# Altium footprint library Semicon-Discrete.pcblib: 205 footprints (part 2 of 13)
Each footprint in its own frame and in the unit in brackets; x right, y up, seen from the top. Pads: shape width x height; smd on the part's side, far side on the other; paste and mask are expansions set on the pad; w line width, h text height; cw(c..) or ccw(c..) is an arc to the next point about the centre after c.
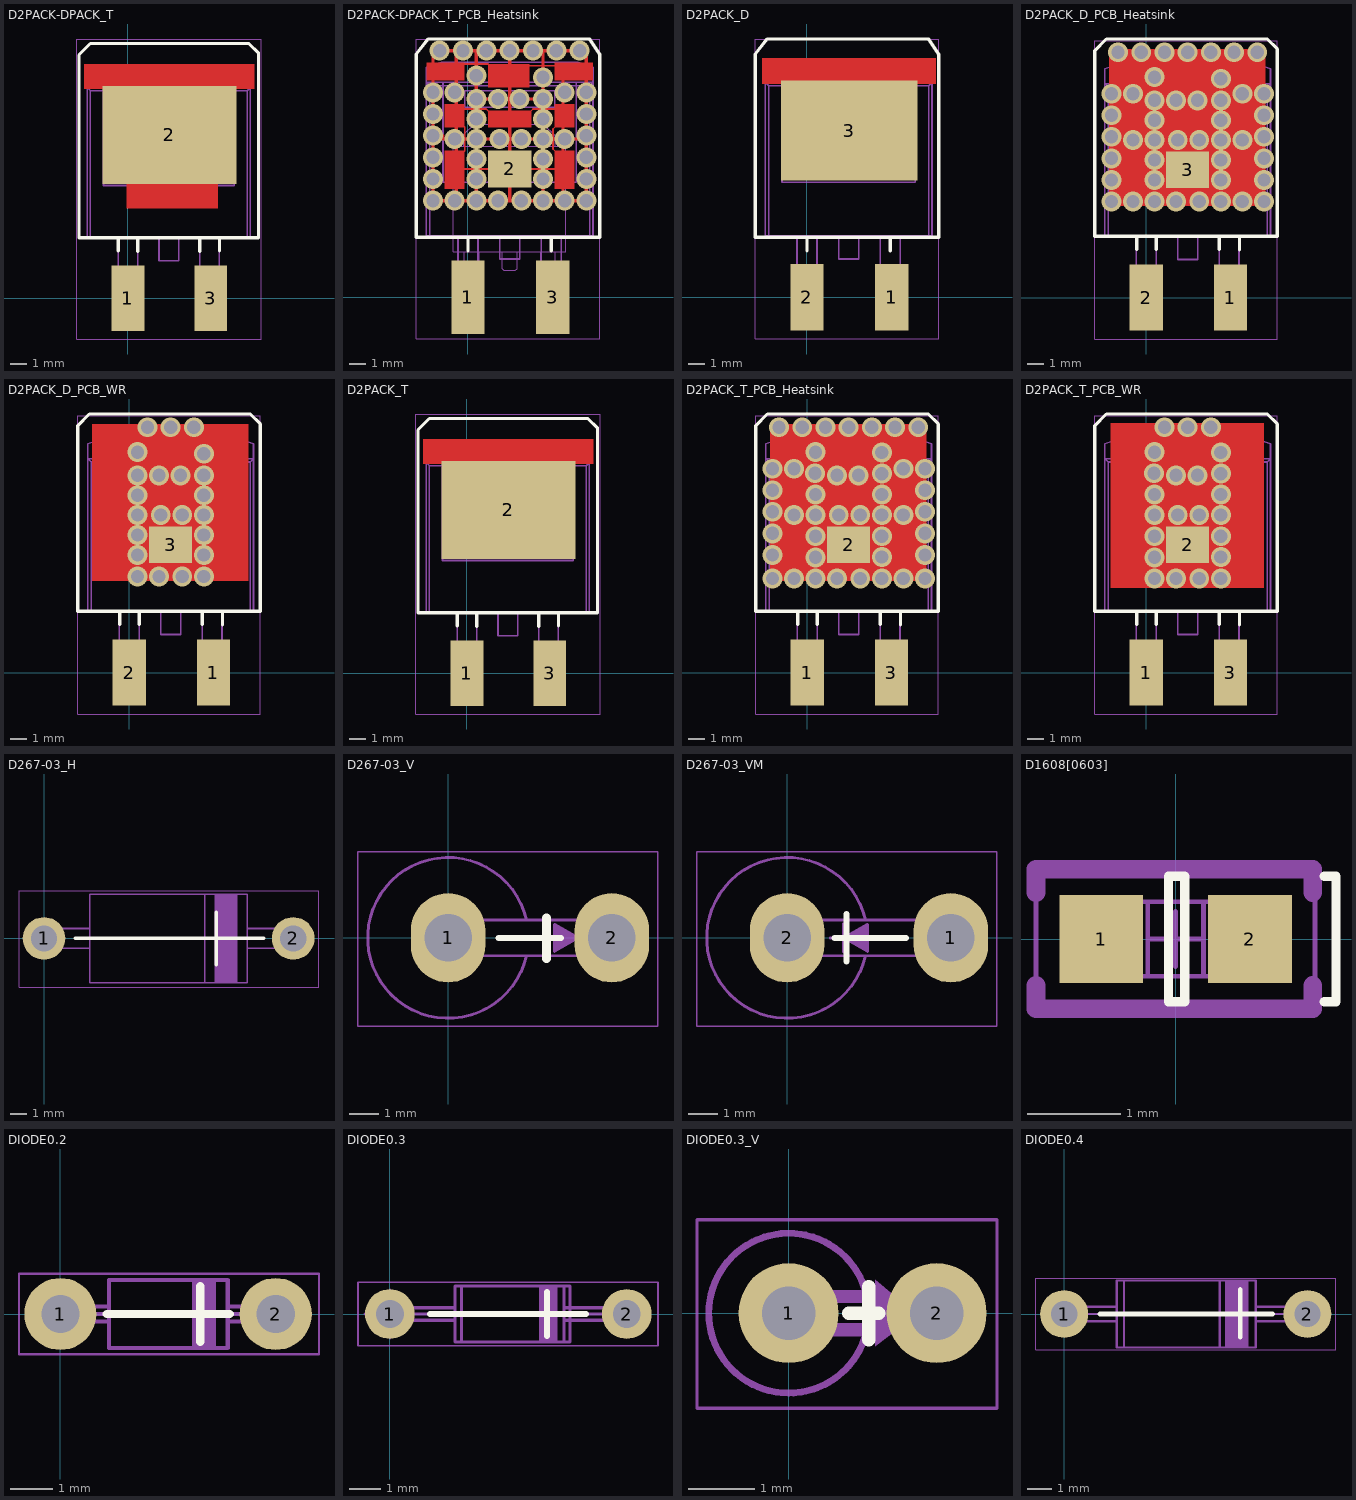
[diagram p1: the footprints below, top view; thin cyan lines are the x and y axes]

## D2PACK-DPACK_T [mm]
height 5
pads (3):
  rect 2x4 smd: 1(0,0) 3(5.08,0)
  rect 8.2x6 smd: 2(2.54,10)
TopLayer:
  rectangle: -2.7,12.8 7.75,14.35
  rectangle: -0.1,5.5 5.5,7.05
TopOverlay:
  lines w0.2: -0.6,2.9 -0.6,3.7 ; 0.6,2.875 0.6,3.675 ; 4.4,2.875 4.4,3.675 ; 5.6,2.9 5.6,3.7 ; -3,3.7 -3,14.9 -2.3,15.6 7.4,15.6 8,15 8,3.7 -3,3.7
TopPaste:
  rectangle: -2.75,12.9 7.75,14.35
  rectangle: 0,5.6 5.3,7.25
TopSolder:
  rectangle: -2.85,12.75 7.85,14.45
  rectangle: -0.25,5.3 5.6,7.15
2-TopCompOutl:
  lines w0.1: -2.3,3.7 -2.3,12.7 ; -0.6,1.7 0.6,1.7 ; -0.6,3.7 -0.6,1.4 -0.4,1.1 -0.4,-1.2 0,-1.2 0.4,-1.2 0.4,1.1 0.6,1.4 0.6,3.7 ; -0.4,0.9 0.4,0.9 ; 1.9,3.7 1.9,2.3 2.5,2.3 3.1,2.3 3.1,3.7 ; 4.4,1.7 5.6,1.7 ; 4.4,3.7 4.4,1.4 4.6,1.1 4.6,-1.2 5,-1.2 5.4,-1.2 5.4,1.1 5.6,1.4 5.6,3.7 ; 4.6,0.9 5.4,0.9 ; 7.3,3.7 7.3,12.7 ; -2.5,12.9 -2.3,12.7 ; -2.5,12.9 -2.5,13.8 -1.6,14.1 2.5,14.1 6.6,14.1 7.5,13.8 7.5,12.9 ; -2.5,12.9 2.5,12.9 7.5,12.9 ; -2.5,12.9 -2.5,3.7 2.5,3.7 7.5,3.7 7.5,12.9 ; -2.3,12.7 2.5,12.7 7.3,12.7 ; 7.3,12.7 7.5,12.9
4-TopCourty:
  circle w0.1: c0,0 r0.35
  lines w0.05: -3.15,-2.5 8.175,-2.5 8.175,15.875 -3.15,15.875 -3.15,-2.5
  lines w0.1: -0.55,0 0.55,0 ; 0,-0.55 0,0.55
5-MCadOutl:
  lines w0.1: -2.5,12.9 -2.5,13.8 -1.6,14.1 2.5,14.1 6.6,14.1 7.5,13.8 7.5,12.9 6.5,12.9 6.5,6.9 2.5,6.9 -1.5,6.9 -1.5,12.9 -2.5,12.9 ; -0.2,11.4 2.5,11.4 5.2,11.4 5.2,12.4 2.5,12.4 -0.2,12.4 -0.2,11.4
7-TopAssy:
  lines w0.1: -2.3,3.7 -2.3,12.7 ; -0.6,1.7 0.6,1.7 ; -0.6,3.7 -0.6,1.4 -0.4,1.1 -0.4,-1.2 0,-1.2 0.4,-1.2 0.4,1.1 0.6,1.4 0.6,3.7 ; -0.4,0.9 0.4,0.9 ; 1.9,3.7 1.9,2.3 2.5,2.3 3.1,2.3 3.1,3.7 ; 4.4,1.7 5.6,1.7 ; 4.4,3.7 4.4,1.4 4.6,1.1 4.6,-1.2 5,-1.2 5.4,-1.2 5.4,1.1 5.6,1.4 5.6,3.7 ; 4.6,0.9 5.4,0.9 ; 7.3,3.7 7.3,12.7 ; -2.5,12.9 -2.5,3.7 2.5,3.7 7.5,3.7 7.5,12.9 ; -2.5,12.9 2.5,12.9 7.5,12.9 ; -2.5,12.9 -2.5,13.8 -1.6,14.1 2.5,14.1 6.6,14.1 7.5,13.8 7.5,12.9 ; -2.5,12.9 -2.3,12.7 ; -2.3,12.7 2.5,12.7 7.3,12.7 ; 7.3,12.7 7.5,12.9
  text ".Designator" at 0.8,5.4 h2.2
3D body "D2PACK_D.STEP": height 4.5, standoff 0, extent -2.525,-1.5 7.475,14.08

## D2PACK-DPACK_T_PCB_Heatsink [mm]
pads (3):
  rect 2x4.4 smd: 1(0,0) 3(5.08,0)
  rect 2.6x2.2 smd: 2(2.5,7.7)
via 3.2,5.8 diameter 1.2 hole 0.8
via 4.5,5.8 diameter 1.2 hole 0.8
via 5.8,5.8 diameter 1.2 hole 0.8
via 1.8,5.8 diameter 1.2 hole 0.8
via 0.5,5.8 diameter 1.2 hole 0.8
via -0.8,5.8 diameter 1.2 hole 0.8
via -2.1,5.8 diameter 1.2 hole 0.8
via -2.1,7.1 diameter 1.2 hole 0.8
via -2.1,8.4 diameter 1.2 hole 0.8
via -2.1,9.7 diameter 1.2 hole 0.8
via -2.1,11 diameter 1.2 hole 0.8
via -1.7,14.8 diameter 1.2 hole 0.8
via -2.1,12.3 diameter 1.2 hole 0.8
via 7.1,12.3 diameter 1.2 hole 0.8
via 6.7,14.8 diameter 1.2 hole 0.8
via 7.1,11 diameter 1.2 hole 0.8
via 7.1,9.7 diameter 1.2 hole 0.8
via 7.1,8.4 diameter 1.2 hole 0.8
via 7.1,7.1 diameter 1.2 hole 0.8
via 7.1,5.8 diameter 1.2 hole 0.8
via 0.5,11.9 diameter 1.2 hole 0.8
via 0.5,13.3 diameter 1.2 hole 0.8
via 1.1,14.8 diameter 1.2 hole 0.8
via -0.3,14.8 diameter 1.2 hole 0.8
via 1.8,11.9 diameter 1.2 hole 0.8
via 0.5,10.7 diameter 1.2 hole 0.8
via 0.5,9.5 diameter 1.2 hole 0.8
via 0.5,8.3 diameter 1.2 hole 0.8
via 0.5,7.1 diameter 1.2 hole 0.8
via 4.5,11.9 diameter 1.2 hole 0.8
via 3.9,14.8 diameter 1.2 hole 0.8
via 2.5,14.8 diameter 1.2 hole 0.8
via 4.5,13.2 diameter 1.2 hole 0.8
via 3.1,11.9 diameter 1.2 hole 0.8
via 4.5,10.7 diameter 1.2 hole 0.8
via 4.5,9.5 diameter 1.2 hole 0.8
via 4.5,8.3 diameter 1.2 hole 0.8
via 4.5,7.1 diameter 1.2 hole 0.8
via 3.2,9.5 diameter 1.2 hole 0.8
via 1.9,9.5 diameter 1.2 hole 0.8
via -0.8,9.5 diameter 1.2 hole 0.8
via 5.3,14.8 diameter 1.2 hole 0.8
via 5.8,12.3 diameter 1.2 hole 0.8
via 5.8,9.5 diameter 1.2 hole 0.8
via -0.8,12.3 diameter 1.2 hole 0.8
TopLayer:
  region: -0.2,8.8 -1.4,8.8 -1.4,6.5 -0.2,6.5
  rectangle: -2.5,13 -0.2,14.1
  region: -0.2,11.6 -1.4,11.6 -1.4,10.2 -0.2,10.2
  region: 6.4,8.8 5.2,8.8 5.2,6.5 6.4,6.5
  region: 6.4,11.6 5.2,11.6 5.2,10.2 6.4,10.2
  rectangle: 5.2,13 7.5,14.1
  rectangle: 1.2,12.6 3.7,14
  rectangle: 1.2,10.2 3.8,11.2
  lines w0.1: -1.5,13.5 -1,14 1.2,14 1.9,13.3 2.5,13.3 ; -0.8,11.1 -0.8,10.8 ; 2.6,10.7 2.5,10.6 ; 6.4,13.6 6.1,13.9 3.1,13.9 2.5,13.3 ; -0.8,10.8 -0.3,11.3 1.1,11.3 1.7,10.7 3.3,10.7 3.9,11.3 5.5,11.3 5.9,10.9 ; -0.8,10.8 -0.2,10.2 -0.2,8.8 -0.8,8.2 -0.8,7.7 2.5,7.7 ; 2.5,7.7 5.8,7.7 5.8,8.2 5.1,8.9 5.1,10.1 5.9,10.9 ; 2.5,7.7 2.5,10.6 ; 2.5,10.6 2.5,13.3 ; 5.9,10.9 5.9,10.9
  lines w0.2: -2.1,9.7 -1.5,9.7 -1.5,9.5 7.1,9.5 7.1,9.7 ; -0.8,5.8 -0.7,5.8 -0.7,14.8 ; 0.5,5.8 0.5,14.8 ; 0.5,11.9 4.5,11.9 ; 2.4,5.8 2.5,5.8 2.5,14.8 ; 4.5,5.8 4.5,14.8 ; 5.7,13.9 5.7,5.8 5.8,5.8 ; -2.1,5.8 -2.1,14.8 7.1,14.8 7.1,5.8 -2.1,5.8
TopOverlay:
  lines w0.2: 0,2.8 0,3.6 ; 5,2.8 5,3.6 ; -3.1,3.6 -3.1,14.6 -2.4,15.5 7.3,15.5 7.9,14.6 7.9,3.6 -3.1,3.6
TopPaste:
  rectangle: -2.6,12.9 -0.1,14.2
  region: -0.1,8.9 -1.5,8.9 -1.5,6.4 -0.1,6.4
  region: -0.1,11.7 -1.5,11.7 -1.5,10.1 -0.1,10.1
  region: 6.5,8.9 5.1,8.9 5.1,6.4 6.5,6.4
  region: 6.5,11.7 5.1,11.7 5.1,10.1 6.5,10.1
  rectangle: 5.1,12.9 7.6,14.2
  rectangle: 1.1,12.5 3.8,14.1
  rectangle: 1.1,10.1 3.9,11.3
TopSolder:
  rectangle: -1.5,6.4 -0.1,8.9
  rectangle: -2.6,12.9 -0.1,14.2
  rectangle: -1.5,10.1 -0.1,11.7
  rectangle: 5.1,6.4 6.5,8.9
  rectangle: 5.1,10.1 6.5,11.7
  rectangle: 5.1,12.9 7.6,14.2
  rectangle: 1.1,12.5 3.8,14.1
  rectangle: 1.1,10.1 3.9,11.3
2-TopCompOutl:
  lines w0.05: -0.275,9.075 -0.25,9.075 -0.25,9.775 0.375,10.4 4.525,10.4 5.225,9.7 5.225,9.075 ; -0.2,2.75 -0.225,2.75 -0.225,0.425 0.675,0.425 0.675,2.75 4.35,2.75 4.35,0.425 5.225,0.425 5.225,2.75 ; 2.05,2.75 2.05,1.725 2.15,1.625 2.85,1.625 2.95,1.725 2.95,2.75 ; -0.875,2.75 -0.875,9.075 5.85,9.075 5.85,2.75 -0.875,2.75
  lines w0.1: -2.3,3.7 -2.3,12.7 ; -0.6,1.7 0.6,1.7 ; -0.6,3.7 -0.6,1.4 -0.4,1.1 -0.4,-1.2 0,-1.2 0.4,-1.2 0.4,1.1 0.6,1.4 0.6,3.7 ; -0.4,0.9 0.4,0.9 ; 1.9,3.7 1.9,2.3 2.5,2.3 3.1,2.3 3.1,3.7 ; 4.4,1.7 5.6,1.7 ; 4.4,3.7 4.4,1.4 4.6,1.1 4.6,-1.2 5,-1.2 5.4,-1.2 5.4,1.1 5.6,1.4 5.6,3.7 ; 4.6,0.9 5.4,0.9 ; 7.3,3.7 7.3,12.7 ; -2.5,12.9 -2.5,3.7 2.5,3.7 7.5,3.7 7.5,12.9 ; -2.5,12.9 2.5,12.9 7.5,12.9 ; -2.5,12.9 -2.5,13.8 -1.6,14.1 2.5,14.1 6.6,14.1 7.5,13.8 7.5,12.9 ; -2.5,12.9 -2.3,12.7 ; -2.3,12.7 2.5,12.7 7.3,12.7 ; 7.3,12.7 7.5,12.9
4-TopCourty:
  circle w0.1: c0,0 r0.35
  lines w0.05: -3.1,-2.5 -3.1,15.5 7.9,15.5 7.9,-2.5 -3.1,-2.5
  lines w0.1: -0.525,0 0.525,0 ; 0,-0.525 0,0.525
5-MCadOutl:
  lines w0.1: -2.5,12.9 -1.5,12.9 -1.5,6.9 2.5,6.9 6.5,6.9 6.5,12.9 7.5,12.9 7.5,13.8 6.6,14.1 2.5,14.1 -1.6,14.1 -2.5,13.8 -2.5,12.9 ; -0.2,11.4 -0.2,12.4 2.5,12.4 5.2,12.4 5.2,11.4 2.5,11.4 -0.2,11.4
7-TopAssy:
  lines w0.1: -2.3,3.7 -2.3,12.7 ; -0.6,1.7 0.6,1.7 ; -0.6,3.7 -0.6,1.4 -0.4,1.1 -0.4,-1.2 0,-1.2 0.4,-1.2 0.4,1.1 0.6,1.4 0.6,3.7 ; -0.4,0.9 0.4,0.9 ; 1.9,3.7 1.9,2.3 2.5,2.3 3.1,2.3 3.1,3.7 ; 4.4,1.7 5.6,1.7 ; 4.4,3.7 4.4,1.4 4.6,1.1 4.6,-1.2 5,-1.2 5.4,-1.2 5.4,1.1 5.6,1.4 5.6,3.7 ; 4.6,0.9 5.4,0.9 ; 7.3,3.7 7.3,12.7 ; -2.5,12.9 -2.5,3.7 2.5,3.7 7.5,3.7 7.5,12.9 ; -2.5,12.9 2.5,12.9 7.5,12.9 ; -2.5,12.9 -2.5,13.8 -1.6,14.1 2.5,14.1 6.6,14.1 7.5,13.8 7.5,12.9 ; -2.5,12.9 -2.3,12.7 ; -2.3,12.7 2.5,12.7 7.3,12.7 ; 7.3,12.7 7.5,12.9
  text ".Designator" at 1.05,7.6 h2.2

## D2PACK_D [mm]
height 5
pads (3):
  rect 2x4 smd: 1(5.08,0) 2(0,0)
  rect 8.2x6 smd: 3(2.54,10)
TopLayer:
  rectangle: -2.7,12.8 7.75,14.35
TopOverlay:
  lines w0.2: 0,2.8 0,3.6 ; 5,2.8 5,3.6 ; -3.1,3.6 -3.1,14.6 -2.4,15.5 7.3,15.5 7.9,14.6 7.9,3.6 -3.1,3.6
TopPaste:
  rectangle: -2.75,12.9 7.75,14.35
TopSolder:
  rectangle: -2.85,12.75 7.85,14.45
2-TopCompOutl:
  lines w0.1: -2.3,3.7 -2.3,12.7 ; -0.6,1.7 0.6,1.7 ; -0.6,3.7 -0.6,1.4 -0.4,1.1 -0.4,-1.2 0,-1.2 0.4,-1.2 0.4,1.1 0.6,1.4 0.6,3.7 ; -0.4,0.9 0.4,0.9 ; 1.9,3.7 1.9,2.3 2.5,2.3 3.1,2.3 3.1,3.7 ; 4.4,1.7 5.6,1.7 ; 4.4,3.7 4.4,1.4 4.6,1.1 4.6,-1.2 5,-1.2 5.4,-1.2 5.4,1.1 5.6,1.4 5.6,3.7 ; 4.6,0.9 5.4,0.9 ; 7.3,3.7 7.3,12.7 ; -2.5,12.9 -2.3,12.7 ; -2.5,12.9 -2.5,13.8 -1.6,14.1 2.5,14.1 6.6,14.1 7.5,13.8 7.5,12.9 ; -2.5,12.9 2.5,12.9 7.5,12.9 ; -2.5,12.9 -2.5,3.7 2.5,3.7 7.5,3.7 7.5,12.9 ; -2.3,12.7 2.5,12.7 7.3,12.7 ; 7.3,12.7 7.5,12.9
4-TopCourty:
  circle w0.1: c0,0 r0.35
  lines w0.05: -3.1,-2.5 -3.1,15.5 7.9,15.5 7.9,-2.5 -3.1,-2.5
  lines w0.1: -0.525,0 0.525,0 ; 0,-0.525 0,0.525
5-MCadOutl:
  lines w0.1: -2.5,12.9 -1.5,12.9 -1.5,6.9 2.5,6.9 6.5,6.9 6.5,12.9 7.5,12.9 7.5,13.8 6.6,14.1 2.5,14.1 -1.6,14.1 -2.5,13.8 -2.5,12.9 ; -0.2,11.4 -0.2,12.4 2.5,12.4 5.2,12.4 5.2,11.4 2.5,11.4 -0.2,11.4
7-TopAssy:
  lines w0.1: -2.3,3.7 -2.3,12.7 ; -0.6,1.7 0.6,1.7 ; -0.6,3.7 -0.6,1.4 -0.4,1.1 -0.4,-1.2 0,-1.2 0.4,-1.2 0.4,1.1 0.6,1.4 0.6,3.7 ; -0.4,0.9 0.4,0.9 ; 1.9,3.7 1.9,2.3 2.5,2.3 3.1,2.3 3.1,3.7 ; 4.4,1.7 5.6,1.7 ; 4.4,3.7 4.4,1.4 4.6,1.1 4.6,-1.2 5,-1.2 5.4,-1.2 5.4,1.1 5.6,1.4 5.6,3.7 ; 4.6,0.9 5.4,0.9 ; 7.3,3.7 7.3,12.7 ; -2.5,12.9 -2.3,12.7 ; -2.5,12.9 -2.5,13.8 -1.6,14.1 2.5,14.1 6.6,14.1 7.5,13.8 7.5,12.9 ; -2.5,12.9 2.5,12.9 7.5,12.9 ; -2.5,12.9 -2.5,3.7 2.5,3.7 7.5,3.7 7.5,12.9 ; -2.3,12.7 2.5,12.7 7.3,12.7 ; 7.3,12.7 7.5,12.9
  text ".Designator" at 0.975,4.8 h2.2
3D body "D2PACK_D.STEP": height 4.5, standoff 0, extent -2.5,-1.49 7.5,14.09

## D2PACK_D_PCB_Heatsink [mm]
height 5
pads (3):
  rect 2x4 smd: 1(5.08,0) 2(0,0)
  rect 2.6x2.2 smd: 3(2.5,7.7)
via -0.8,12.3 diameter 1.2 hole 0.8
via 5.8,9.5 diameter 1.2 hole 0.8
via 5.8,12.3 diameter 1.2 hole 0.8
via 5.3,14.8 diameter 1.2 hole 0.8
via -0.8,9.5 diameter 1.2 hole 0.8
via 1.9,9.5 diameter 1.2 hole 0.8
via 3.2,9.5 diameter 1.2 hole 0.8
via 4.5,7.1 diameter 1.2 hole 0.8
via 4.5,8.3 diameter 1.2 hole 0.8
via 4.5,9.5 diameter 1.2 hole 0.8
via 4.5,10.7 diameter 1.2 hole 0.8
via 3.1,11.9 diameter 1.2 hole 0.8
via 4.5,13.2 diameter 1.2 hole 0.8
via 2.5,14.8 diameter 1.2 hole 0.8
via 3.9,14.8 diameter 1.2 hole 0.8
via 4.5,11.9 diameter 1.2 hole 0.8
via 0.5,7.1 diameter 1.2 hole 0.8
via 0.5,8.3 diameter 1.2 hole 0.8
via 0.5,9.5 diameter 1.2 hole 0.8
via 0.5,10.7 diameter 1.2 hole 0.8
via 1.8,11.9 diameter 1.2 hole 0.8
via -0.3,14.8 diameter 1.2 hole 0.8
via 1.1,14.8 diameter 1.2 hole 0.8
via 0.5,13.3 diameter 1.2 hole 0.8
via 0.5,11.9 diameter 1.2 hole 0.8
via 7.1,5.8 diameter 1.2 hole 0.8
via 7.1,7.1 diameter 1.2 hole 0.8
via 7.1,8.4 diameter 1.2 hole 0.8
via 7.1,9.7 diameter 1.2 hole 0.8
via 7.1,11 diameter 1.2 hole 0.8
via 6.7,14.8 diameter 1.2 hole 0.8
via 7.1,12.3 diameter 1.2 hole 0.8
via -2.1,12.3 diameter 1.2 hole 0.8
via -1.7,14.8 diameter 1.2 hole 0.8
via -2.1,11 diameter 1.2 hole 0.8
via -2.1,9.7 diameter 1.2 hole 0.8
via -2.1,8.4 diameter 1.2 hole 0.8
via -2.1,7.1 diameter 1.2 hole 0.8
via -2.1,5.8 diameter 1.2 hole 0.8
via -0.8,5.8 diameter 1.2 hole 0.8
via 0.5,5.8 diameter 1.2 hole 0.8
via 1.8,5.8 diameter 1.2 hole 0.8
via 5.8,5.8 diameter 1.2 hole 0.8
via 4.5,5.8 diameter 1.2 hole 0.8
via 3.2,5.8 diameter 1.2 hole 0.8
TopLayer:
  rectangle: -2.25,5.525 7.2,15
TopOverlay:
  lines w0.2: -0.575,2.9 -0.575,3.7 ; 0.6,2.9 0.6,3.7 ; 4.4,2.9 4.4,3.7 ; 5.625,2.875 5.625,3.675 ; -3.1,3.7 -3.1,14.9 -2.4,15.6 7.3,15.6 7.9,15 7.9,3.7 -3.1,3.7
TopPaste:
  rectangle: 1.1,10.1 3.9,11.3
  rectangle: 1.1,12.5 3.8,14.1
  rectangle: 5.1,12.9 7.6,14.2
  region: 6.5,11.7 5.1,11.7 5.1,10.1 6.5,10.1
  region: 6.5,8.9 5.1,8.9 5.1,6.4 6.5,6.4
  region: -0.1,11.7 -1.5,11.7 -1.5,10.1 -0.1,10.1
  region: -0.1,8.9 -1.5,8.9 -1.5,6.4 -0.1,6.4
  rectangle: -2.6,12.9 -0.1,14.2
TopSolder:
  rectangle: 1.1,10.1 3.9,11.3
  rectangle: 1.1,12.5 3.8,14.1
  rectangle: 5.1,12.9 7.6,14.2
  rectangle: 5.1,10.1 6.5,11.7
  rectangle: 5.1,6.4 6.5,8.9
  rectangle: -1.5,10.1 -0.1,11.7
  rectangle: -2.6,12.9 -0.1,14.2
  rectangle: -1.5,6.4 -0.1,8.9
2-TopCompOutl:
  lines w0.1: -2.3,3.7 -2.3,12.7 ; -0.6,1.7 0.6,1.7 ; -0.6,3.7 -0.6,1.4 -0.4,1.1 -0.4,-1.2 0,-1.2 0.4,-1.2 0.4,1.1 0.6,1.4 0.6,3.7 ; -0.4,0.9 0.4,0.9 ; 1.9,3.7 1.9,2.3 2.5,2.3 3.1,2.3 3.1,3.7 ; 4.4,1.7 5.6,1.7 ; 4.4,3.7 4.4,1.4 4.6,1.1 4.6,-1.2 5,-1.2 5.4,-1.2 5.4,1.1 5.6,1.4 5.6,3.7 ; 4.6,0.9 5.4,0.9 ; 7.3,3.7 7.3,12.7 ; -2.5,12.9 -2.3,12.7 ; -2.5,12.9 -2.5,13.8 -1.6,14.1 2.5,14.1 6.6,14.1 7.5,13.8 7.5,12.9 ; -2.5,12.9 2.5,12.9 7.5,12.9 ; -2.5,12.9 -2.5,3.7 2.5,3.7 7.5,3.7 7.5,12.9 ; -2.3,12.7 2.5,12.7 7.3,12.7 ; 7.3,12.7 7.5,12.9
4-TopCourty:
  circle w0.1: c0,0 r0.35
  lines w0.05: -3.1,-2.5 7.9,-2.5 7.9,15.5 -3.1,15.5 -3.1,-2.5
  lines w0.1: -0.525,0 0.525,0 ; 0,-0.525 0,0.525
5-MCadOutl:
  lines w0.1: -2.5,12.9 -2.5,13.8 -1.6,14.1 2.5,14.1 6.6,14.1 7.5,13.8 7.5,12.9 6.5,12.9 6.5,6.9 2.5,6.9 -1.5,6.9 -1.5,12.9 -2.5,12.9 ; -0.2,11.4 2.5,11.4 5.2,11.4 5.2,12.4 2.5,12.4 -0.2,12.4 -0.2,11.4
7-TopAssy:
  lines w0.1: -2.3,3.7 -2.3,12.7 ; -0.6,1.7 0.6,1.7 ; -0.6,3.7 -0.6,1.4 -0.4,1.1 -0.4,-1.2 0,-1.2 0.4,-1.2 0.4,1.1 0.6,1.4 0.6,3.7 ; -0.4,0.9 0.4,0.9 ; 1.9,3.7 1.9,2.3 2.5,2.3 3.1,2.3 3.1,3.7 ; 4.4,1.7 5.6,1.7 ; 4.4,3.7 4.4,1.4 4.6,1.1 4.6,-1.2 5,-1.2 5.4,-1.2 5.4,1.1 5.6,1.4 5.6,3.7 ; 4.6,0.9 5.4,0.9 ; 7.3,3.7 7.3,12.7 ; -2.5,12.9 -2.3,12.7 ; -2.5,12.9 -2.5,13.8 -1.6,14.1 2.5,14.1 6.6,14.1 7.5,13.8 7.5,12.9 ; -2.5,12.9 2.5,12.9 7.5,12.9 ; -2.5,12.9 -2.5,3.7 2.5,3.7 7.5,3.7 7.5,12.9 ; -2.3,12.7 2.5,12.7 7.3,12.7 ; 7.3,12.7 7.5,12.9
  text ".Designator" at 0.825,7.025 h2.2
3D body "D2PACK_D.STEP": height 4.5, standoff 0, extent -2.5,-1.2 7.5,14.38

## D2PACK_D_PCB_WR [mm]
height 5
pads (3):
  rect 2x4 smd: 1(5.08,0) 2(0,0)
  rect 2.6x2.2 smd: 3(2.5,7.7)
via 1.9,9.5 diameter 1.2 hole 0.8
via 3.2,9.5 diameter 1.2 hole 0.8
via 4.5,7.1 diameter 1.2 hole 0.8
via 4.5,8.3 diameter 1.2 hole 0.8
via 4.5,9.5 diameter 1.2 hole 0.8
via 4.5,10.7 diameter 1.2 hole 0.8
via 3.1,11.9 diameter 1.2 hole 0.8
via 4.5,13.2 diameter 1.2 hole 0.8
via 2.5,14.8 diameter 1.2 hole 0.8
via 3.9,14.8 diameter 1.2 hole 0.8
via 4.5,11.9 diameter 1.2 hole 0.8
via 0.5,7.1 diameter 1.2 hole 0.8
via 0.5,8.3 diameter 1.2 hole 0.8
via 0.5,9.5 diameter 1.2 hole 0.8
via 0.5,10.7 diameter 1.2 hole 0.8
via 1.8,11.9 diameter 1.2 hole 0.8
via 1.1,14.8 diameter 1.2 hole 0.8
via 0.5,13.3 diameter 1.2 hole 0.8
via 0.5,11.9 diameter 1.2 hole 0.8
via 0.5,5.8 diameter 1.2 hole 0.8
via 1.8,5.8 diameter 1.2 hole 0.8
via 4.5,5.8 diameter 1.2 hole 0.8
via 3.2,5.8 diameter 1.2 hole 0.8
TopLayer:
  rectangle: -2.25,5.525 7.2,15
TopOverlay:
  lines w0.2: -0.575,2.9 -0.575,3.7 ; 0.6,2.9 0.6,3.7 ; 4.4,2.9 4.4,3.7 ; 5.625,2.875 5.625,3.675 ; -3.1,3.7 -3.1,14.9 -2.4,15.6 7.3,15.6 7.9,15 7.9,3.7 -3.1,3.7
TopPaste:
  rectangle: 1.1,10.1 3.9,11.3
  rectangle: 1.1,12.5 3.8,14.1
  rectangle: 5.1,12.9 7.1,14.2
  region: 6.5,11.7 5.1,11.7 5.1,10.1 6.5,10.1
  region: 6.5,8.9 5.1,8.9 5.1,6.4 6.5,6.4
  region: -0.1,11.7 -1.5,11.7 -1.5,10.1 -0.1,10.1
  region: -0.1,8.9 -1.5,8.9 -1.5,6.4 -0.1,6.4
  rectangle: -2.2,12.9 -0.1,14.2
TopSolder:
  rectangle: 1.1,10.1 3.9,11.3
  rectangle: 1.1,12.5 3.8,14.1
  rectangle: 5.1,12.9 7.1,14.2
  rectangle: 5.1,10.1 6.5,11.7
  rectangle: 5.1,6.4 6.5,8.9
  rectangle: -1.5,10.1 -0.1,11.7
  rectangle: -2.2,12.9 -0.1,14.2
  rectangle: -1.5,6.4 -0.1,8.9
2-TopCompOutl:
  lines w0.1: -2.3,3.7 -2.3,12.7 ; -0.6,1.7 0.6,1.7 ; -0.6,3.7 -0.6,1.4 -0.4,1.1 -0.4,-1.2 0,-1.2 0.4,-1.2 0.4,1.1 0.6,1.4 0.6,3.7 ; -0.4,0.9 0.4,0.9 ; 1.9,3.7 1.9,2.3 2.5,2.3 3.1,2.3 3.1,3.7 ; 4.4,1.7 5.6,1.7 ; 4.4,3.7 4.4,1.4 4.6,1.1 4.6,-1.2 5,-1.2 5.4,-1.2 5.4,1.1 5.6,1.4 5.6,3.7 ; 4.6,0.9 5.4,0.9 ; 7.3,3.7 7.3,12.7 ; -2.5,12.9 -2.3,12.7 ; -2.5,12.9 -2.5,13.8 -1.6,14.1 2.5,14.1 6.6,14.1 7.5,13.8 7.5,12.9 ; -2.5,12.9 2.5,12.9 7.5,12.9 ; -2.5,12.9 -2.5,3.7 2.5,3.7 7.5,3.7 7.5,12.9 ; -2.3,12.7 2.5,12.7 7.3,12.7 ; 7.3,12.7 7.5,12.9
4-TopCourty:
  circle w0.1: c0,0 r0.35
  lines w0.05: -3.1,-2.5 7.9,-2.5 7.9,15.5 -3.1,15.5 -3.1,-2.5
  lines w0.1: -0.525,0 0.525,0 ; 0,-0.525 0,0.525
5-MCadOutl:
  lines w0.1: -2.5,12.9 -2.5,13.8 -1.6,14.1 2.5,14.1 6.6,14.1 7.5,13.8 7.5,12.9 6.5,12.9 6.5,6.9 2.5,6.9 -1.5,6.9 -1.5,12.9 -2.5,12.9 ; -0.2,11.4 2.5,11.4 5.2,11.4 5.2,12.4 2.5,12.4 -0.2,12.4 -0.2,11.4
7-TopAssy:
  lines w0.1: -2.3,3.7 -2.3,12.7 ; -0.6,1.7 0.6,1.7 ; -0.6,3.7 -0.6,1.4 -0.4,1.1 -0.4,-1.2 0,-1.2 0.4,-1.2 0.4,1.1 0.6,1.4 0.6,3.7 ; -0.4,0.9 0.4,0.9 ; 1.9,3.7 1.9,2.3 2.5,2.3 3.1,2.3 3.1,3.7 ; 4.4,1.7 5.6,1.7 ; 4.4,3.7 4.4,1.4 4.6,1.1 4.6,-1.2 5,-1.2 5.4,-1.2 5.4,1.1 5.6,1.4 5.6,3.7 ; 4.6,0.9 5.4,0.9 ; 7.3,3.7 7.3,12.7 ; -2.5,12.9 -2.3,12.7 ; -2.5,12.9 -2.5,13.8 -1.6,14.1 2.5,14.1 6.6,14.1 7.5,13.8 7.5,12.9 ; -2.5,12.9 2.5,12.9 7.5,12.9 ; -2.5,12.9 -2.5,3.7 2.5,3.7 7.5,3.7 7.5,12.9 ; -2.3,12.7 2.5,12.7 7.3,12.7 ; 7.3,12.7 7.5,12.9
  text ".Designator" at 0.825,7.025 h2.2
3D body "D2PACK_D.STEP": height 4.5, standoff 0, extent -2.5,-1.2 7.5,14.38

## D2PACK_T [mm]
height 5
pads (3):
  rect 2x4 smd: 1(0,0) 3(5.08,0)
  rect 8.2x6 smd: 2(2.54,10)
TopLayer:
  rectangle: -2.7,12.8 7.75,14.35
TopOverlay:
  lines w0.2: -0.6,2.9 -0.6,3.7 ; 0.6,2.875 0.6,3.675 ; 4.4,2.875 4.4,3.675 ; 5.6,2.9 5.6,3.7 ; -3,3.7 8,3.7 8,15 7.4,15.6 -2.3,15.6 -3,14.9 -3,3.7
TopPaste:
  rectangle: -2.75,12.9 7.75,14.35
TopSolder:
  rectangle: -2.85,12.75 7.85,14.45
2-TopCompOutl:
  lines w0.1: -2.3,3.7 -2.3,12.7 ; -0.6,1.7 0.6,1.7 ; -0.6,3.7 -0.6,1.4 -0.4,1.1 -0.4,-1.2 0,-1.2 0.4,-1.2 0.4,1.1 0.6,1.4 0.6,3.7 ; -0.4,0.9 0.4,0.9 ; 1.9,3.7 1.9,2.3 2.5,2.3 3.1,2.3 3.1,3.7 ; 4.4,1.7 5.6,1.7 ; 4.4,3.7 4.4,1.4 4.6,1.1 4.6,-1.2 5,-1.2 5.4,-1.2 5.4,1.1 5.6,1.4 5.6,3.7 ; 4.6,0.9 5.4,0.9 ; 7.3,3.7 7.3,12.7 ; -2.5,12.9 -2.5,3.7 2.5,3.7 7.5,3.7 7.5,12.9 ; -2.5,12.9 2.5,12.9 7.5,12.9 ; -2.5,12.9 -2.5,13.8 -1.6,14.1 2.5,14.1 6.6,14.1 7.5,13.8 7.5,12.9 ; -2.5,12.9 -2.3,12.7 ; -2.3,12.7 2.5,12.7 7.3,12.7 ; 7.3,12.7 7.5,12.9
4-TopCourty:
  circle w0.1: c0,0 r0.35
  lines w0.05: -3.15,-2.5 -3.15,15.875 8.175,15.875 8.175,-2.5 -3.15,-2.5
  lines w0.1: -0.55,0 0.55,0 ; 0,-0.55 0,0.55
5-MCadOutl:
  lines w0.1: -2.5,12.9 -1.5,12.9 -1.5,6.9 2.5,6.9 6.5,6.9 6.5,12.9 7.5,12.9 7.5,13.8 6.6,14.1 2.5,14.1 -1.6,14.1 -2.5,13.8 -2.5,12.9 ; -0.2,11.4 -0.2,12.4 2.5,12.4 5.2,12.4 5.2,11.4 2.5,11.4 -0.2,11.4
7-TopAssy:
  lines w0.1: -2.3,3.7 -2.3,12.7 ; -0.6,1.7 0.6,1.7 ; -0.6,3.7 -0.6,1.4 -0.4,1.1 -0.4,-1.2 0,-1.2 0.4,-1.2 0.4,1.1 0.6,1.4 0.6,3.7 ; -0.4,0.9 0.4,0.9 ; 1.9,3.7 1.9,2.3 2.5,2.3 3.1,2.3 3.1,3.7 ; 4.4,1.7 5.6,1.7 ; 4.4,3.7 4.4,1.4 4.6,1.1 4.6,-1.2 5,-1.2 5.4,-1.2 5.4,1.1 5.6,1.4 5.6,3.7 ; 4.6,0.9 5.4,0.9 ; 7.3,3.7 7.3,12.7 ; -2.5,12.9 -2.3,12.7 ; -2.5,12.9 -2.5,13.8 -1.6,14.1 2.5,14.1 6.6,14.1 7.5,13.8 7.5,12.9 ; -2.5,12.9 2.5,12.9 7.5,12.9 ; -2.5,12.9 -2.5,3.7 2.5,3.7 7.5,3.7 7.5,12.9 ; -2.3,12.7 2.5,12.7 7.3,12.7 ; 7.3,12.7 7.5,12.9
  text ".Designator" at 0.8,5.4 h2.2
3D body "D2PACK_D.STEP": height 4.5, standoff 0, extent -2.525,-1.5 7.475,14.08

## D2PACK_T_PCB_Heatsink [mm]
height 5
pads (3):
  rect 2x4 smd: 1(0,0) 3(5.08,0)
  rect 2.6x2.2 smd: 2(2.5,7.7)
via -0.8,12.3 diameter 1.2 hole 0.8
via 5.8,9.5 diameter 1.2 hole 0.8
via 5.8,12.3 diameter 1.2 hole 0.8
via 5.3,14.8 diameter 1.2 hole 0.8
via -0.8,9.5 diameter 1.2 hole 0.8
via 1.9,9.5 diameter 1.2 hole 0.8
via 3.2,9.5 diameter 1.2 hole 0.8
via 4.5,9.5 diameter 1.2 hole 0.8
via 3.1,11.9 diameter 1.2 hole 0.8
via 2.5,14.8 diameter 1.2 hole 0.8
via 3.9,14.8 diameter 1.2 hole 0.8
via 0.5,9.5 diameter 1.2 hole 0.8
via 1.8,11.9 diameter 1.2 hole 0.8
via -0.3,14.8 diameter 1.2 hole 0.8
via 1.1,14.8 diameter 1.2 hole 0.8
via 0.5,13.3 diameter 1.2 hole 0.8
via 7.1,5.675 diameter 1.2 hole 0.8
via 7.1,7.1 diameter 1.2 hole 0.8
via 7.1,8.4 diameter 1.2 hole 0.8
via 7.1,9.7 diameter 1.2 hole 0.8
via 7.1,11 diameter 1.2 hole 0.8
via 6.7,14.8 diameter 1.2 hole 0.8
via 7.1,12.3 diameter 1.2 hole 0.8
via -2.1,12.3 diameter 1.2 hole 0.8
via -1.7,14.8 diameter 1.2 hole 0.8
via -2.1,11 diameter 1.2 hole 0.8
via -2.1,9.7 diameter 1.2 hole 0.8
via -2.1,8.4 diameter 1.2 hole 0.8
via -2.1,7.1 diameter 1.2 hole 0.8
via -2.1,5.675 diameter 1.2 hole 0.8
via -0.8,5.675 diameter 1.2 hole 0.8
via 0.5,5.675 diameter 1.2 hole 0.8
via 5.8,5.675 diameter 1.2 hole 0.8
via 4.5,5.675 diameter 1.2 hole 0.8
via 3.2,5.675 diameter 1.2 hole 0.8
via 0.475,12.025 diameter 1.2 hole 0.8
via 0.5,10.75 diameter 1.2 hole 0.8
via 1.8,5.675 diameter 1.2 hole 0.8
via 0.5,6.95 diameter 1.2 hole 0.8
via 0.5,8.225 diameter 1.2 hole 0.8
via 4.5,6.975 diameter 1.2 hole 0.8
via 4.5,8.225 diameter 1.2 hole 0.8
via 4.5,13.275 diameter 1.2 hole 0.8
via 4.5,10.75 diameter 1.2 hole 0.8
via 4.5,12 diameter 1.2 hole 0.8
TopLayer:
  rectangle: -2.25,5.525 7.2,15
TopOverlay:
  lines w0.2: -0.575,2.9 -0.575,3.7 ; 0.6,2.9 0.6,3.7 ; 4.4,2.9 4.4,3.7 ; 5.625,2.875 5.625,3.675 ; -3.1,3.7 -3.1,14.9 -2.4,15.6 7.3,15.6 7.9,15 7.9,3.7 -3.1,3.7
TopPaste:
  rectangle: 1.1,10.1 3.9,11.3
  rectangle: 1.1,12.5 3.8,14.1
  rectangle: 5.1,12.9 7.6,14.2
  region: 6.5,11.7 5.1,11.7 5.1,10.1 6.5,10.1
  region: 6.5,8.9 5.1,8.9 5.1,6.4 6.5,6.4
  region: -0.1,11.7 -1.5,11.7 -1.5,10.1 -0.1,10.1
  region: -0.1,8.9 -1.5,8.9 -1.5,6.4 -0.1,6.4
  rectangle: -2.6,12.9 -0.1,14.2
TopSolder:
  rectangle: 1.1,10.1 3.9,11.3
  rectangle: 1.1,12.5 3.8,14.1
  rectangle: 5.1,12.9 7.6,14.2
  rectangle: 5.1,10.1 6.5,11.7
  rectangle: 5.1,6.4 6.5,8.9
  rectangle: -1.5,10.1 -0.1,11.7
  rectangle: -2.6,12.9 -0.1,14.2
  rectangle: -1.5,6.4 -0.1,8.9
2-TopCompOutl:
  lines w0.1: -2.3,3.7 -2.3,12.7 ; -0.6,1.7 0.6,1.7 ; -0.6,3.7 -0.6,1.4 -0.4,1.1 -0.4,-1.2 0,-1.2 0.4,-1.2 0.4,1.1 0.6,1.4 0.6,3.7 ; -0.4,0.9 0.4,0.9 ; 1.9,3.7 1.9,2.3 2.5,2.3 3.1,2.3 3.1,3.7 ; 4.4,1.7 5.6,1.7 ; 4.4,3.7 4.4,1.4 4.6,1.1 4.6,-1.2 5,-1.2 5.4,-1.2 5.4,1.1 5.6,1.4 5.6,3.7 ; 4.6,0.9 5.4,0.9 ; 7.3,3.7 7.3,12.7 ; -2.5,12.9 -2.3,12.7 ; -2.5,12.9 -2.5,13.8 -1.6,14.1 2.5,14.1 6.6,14.1 7.5,13.8 7.5,12.9 ; -2.5,12.9 2.5,12.9 7.5,12.9 ; -2.5,12.9 -2.5,3.7 2.5,3.7 7.5,3.7 7.5,12.9 ; -2.3,12.7 2.5,12.7 7.3,12.7 ; 7.3,12.7 7.5,12.9
4-TopCourty:
  circle w0.1: c0,0 r0.35
  lines w0.05: -3.1,-2.5 7.9,-2.5 7.9,15.5 -3.1,15.5 -3.1,-2.5
  lines w0.1: -0.525,0 0.525,0 ; 0,-0.525 0,0.525
5-MCadOutl:
  lines w0.1: -2.5,12.9 -2.5,13.8 -1.6,14.1 2.5,14.1 6.6,14.1 7.5,13.8 7.5,12.9 6.5,12.9 6.5,6.9 2.5,6.9 -1.5,6.9 -1.5,12.9 -2.5,12.9 ; -0.2,11.4 2.5,11.4 5.2,11.4 5.2,12.4 2.5,12.4 -0.2,12.4 -0.2,11.4
7-TopAssy:
  lines w0.1: -2.3,3.7 -2.3,12.7 ; -0.6,1.7 0.6,1.7 ; -0.6,3.7 -0.6,1.4 -0.4,1.1 -0.4,-1.2 0,-1.2 0.4,-1.2 0.4,1.1 0.6,1.4 0.6,3.7 ; -0.4,0.9 0.4,0.9 ; 1.9,3.7 1.9,2.3 2.5,2.3 3.1,2.3 3.1,3.7 ; 4.4,1.7 5.6,1.7 ; 4.4,3.7 4.4,1.4 4.6,1.1 4.6,-1.2 5,-1.2 5.4,-1.2 5.4,1.1 5.6,1.4 5.6,3.7 ; 4.6,0.9 5.4,0.9 ; 7.3,3.7 7.3,12.7 ; -2.5,12.9 -2.3,12.7 ; -2.5,12.9 -2.5,13.8 -1.6,14.1 2.5,14.1 6.6,14.1 7.5,13.8 7.5,12.9 ; -2.5,12.9 2.5,12.9 7.5,12.9 ; -2.5,12.9 -2.5,3.7 2.5,3.7 7.5,3.7 7.5,12.9 ; -2.3,12.7 2.5,12.7 7.3,12.7 ; 7.3,12.7 7.5,12.9
  text ".Designator" at 1.025,7.325 h2.2
3D body "D2PACK_D.STEP": height 4.5, standoff 0, extent -2.5,-1.2 7.5,14.38

## D2PACK_T_PCB_WR [mm]
height 5
pads (3):
  rect 2x4 smd: 1(0,0) 3(5.08,0)
  rect 2.6x2.2 smd: 2(2.5,7.7)
via 1.9,9.5 diameter 1.2 hole 0.8
via 3.2,9.5 diameter 1.2 hole 0.8
via 4.5,9.5 diameter 1.2 hole 0.8
via 3.1,11.9 diameter 1.2 hole 0.8
via 2.5,14.8 diameter 1.2 hole 0.8
via 3.9,14.8 diameter 1.2 hole 0.8
via 0.5,9.5 diameter 1.2 hole 0.8
via 1.8,11.9 diameter 1.2 hole 0.8
via 1.1,14.8 diameter 1.2 hole 0.8
via 0.5,13.3 diameter 1.2 hole 0.8
via 0.5,5.675 diameter 1.2 hole 0.8
via 4.5,5.675 diameter 1.2 hole 0.8
via 3.2,5.675 diameter 1.2 hole 0.8
via 0.475,12.025 diameter 1.2 hole 0.8
via 0.5,10.75 diameter 1.2 hole 0.8
via 1.8,5.675 diameter 1.2 hole 0.8
via 0.5,6.95 diameter 1.2 hole 0.8
via 0.5,8.225 diameter 1.2 hole 0.8
via 4.5,6.975 diameter 1.2 hole 0.8
via 4.5,8.225 diameter 1.2 hole 0.8
via 4.5,13.275 diameter 1.2 hole 0.8
via 4.5,10.75 diameter 1.2 hole 0.8
via 4.5,12 diameter 1.2 hole 0.8
TopLayer:
  rectangle: -2.15,5.1 7.1,15.05
TopOverlay:
  lines w0.2: -0.575,2.9 -0.575,3.7 ; 0.6,2.9 0.6,3.7 ; 4.4,2.9 4.4,3.7 ; 5.625,2.875 5.625,3.675 ; -3.1,3.7 -3.1,14.9 -2.4,15.6 7.3,15.6 7.9,15 7.9,3.7 -3.1,3.7
TopPaste:
  rectangle: 1.1,10.1 3.9,11.3
  rectangle: 1.1,12.5 3.8,14.1
  rectangle: 5.1,12.9 7,14.2
  region: 6.5,11.7 5.1,11.7 5.1,10.1 6.5,10.1
  region: 6.5,8.9 5.1,8.9 5.1,6.4 6.5,6.4
  region: -0.1,11.7 -1.5,11.7 -1.5,10.1 -0.1,10.1
  region: -0.1,8.9 -1.5,8.9 -1.5,6.4 -0.1,6.4
  rectangle: -2,12.9 -0.1,14.2
TopSolder:
  rectangle: 1.1,10.1 3.9,11.3
  rectangle: 1.1,12.5 3.8,14.1
  rectangle: 5.1,12.9 6.95,14.2
  rectangle: 5.1,10.1 6.5,11.7
  rectangle: 5.1,6.4 6.5,8.9
  rectangle: -1.5,10.1 -0.1,11.7
  rectangle: -2,12.9 -0.1,14.2
  rectangle: -1.5,6.4 -0.1,8.9
2-TopCompOutl:
  lines w0.1: -2.3,3.7 -2.3,12.7 ; -0.6,1.7 0.6,1.7 ; -0.6,3.7 -0.6,1.4 -0.4,1.1 -0.4,-1.2 0,-1.2 0.4,-1.2 0.4,1.1 0.6,1.4 0.6,3.7 ; -0.4,0.9 0.4,0.9 ; 1.9,3.7 1.9,2.3 2.5,2.3 3.1,2.3 3.1,3.7 ; 4.4,1.7 5.6,1.7 ; 4.4,3.7 4.4,1.4 4.6,1.1 4.6,-1.2 5,-1.2 5.4,-1.2 5.4,1.1 5.6,1.4 5.6,3.7 ; 4.6,0.9 5.4,0.9 ; 7.3,3.7 7.3,12.7 ; -2.5,12.9 -2.3,12.7 ; -2.5,12.9 -2.5,13.8 -1.6,14.1 2.5,14.1 6.6,14.1 7.5,13.8 7.5,12.9 ; -2.5,12.9 2.5,12.9 7.5,12.9 ; -2.5,12.9 -2.5,3.7 2.5,3.7 7.5,3.7 7.5,12.9 ; -2.3,12.7 2.5,12.7 7.3,12.7 ; 7.3,12.7 7.5,12.9
4-TopCourty:
  circle w0.1: c0,0 r0.35
  lines w0.05: -3.1,-2.5 7.9,-2.5 7.9,15.5 -3.1,15.5 -3.1,-2.5
  lines w0.1: -0.525,0 0.525,0 ; 0,-0.525 0,0.525
5-MCadOutl:
  lines w0.1: -2.5,12.9 -2.5,13.8 -1.6,14.1 2.5,14.1 6.6,14.1 7.5,13.8 7.5,12.9 6.5,12.9 6.5,6.9 2.5,6.9 -1.5,6.9 -1.5,12.9 -2.5,12.9 ; -0.2,11.4 2.5,11.4 5.2,11.4 5.2,12.4 2.5,12.4 -0.2,12.4 -0.2,11.4
7-TopAssy:
  lines w0.1: -2.3,3.7 -2.3,12.7 ; -0.6,1.7 0.6,1.7 ; -0.6,3.7 -0.6,1.4 -0.4,1.1 -0.4,-1.2 0,-1.2 0.4,-1.2 0.4,1.1 0.6,1.4 0.6,3.7 ; -0.4,0.9 0.4,0.9 ; 1.9,3.7 1.9,2.3 2.5,2.3 3.1,2.3 3.1,3.7 ; 4.4,1.7 5.6,1.7 ; 4.4,3.7 4.4,1.4 4.6,1.1 4.6,-1.2 5,-1.2 5.4,-1.2 5.4,1.1 5.6,1.4 5.6,3.7 ; 4.6,0.9 5.4,0.9 ; 7.3,3.7 7.3,12.7 ; -2.5,12.9 -2.3,12.7 ; -2.5,12.9 -2.5,13.8 -1.6,14.1 2.5,14.1 6.6,14.1 7.5,13.8 7.5,12.9 ; -2.5,12.9 2.5,12.9 7.5,12.9 ; -2.5,12.9 -2.5,3.7 2.5,3.7 7.5,3.7 7.5,12.9 ; -2.3,12.7 2.5,12.7 7.3,12.7 ; 7.3,12.7 7.5,12.9
  text ".Designator" at 1.025,7.325 h2.2
3D body "D2PACK_D.STEP": height 4.5, standoff 0, extent -2.5,-1.2 7.5,14.38

## D267-03_H [mm]
pads (2):
  round 2.6 hole 1.6: 1(0,0) 2(15.2,0)
TopOverlay:
  lines w0.2: 1.9,0 13.4,0 ; 10.5,-1.6 10.5,1.6
2-TopCompOutl:
  lines w0.1: 2.8,-0.6 0,-0.6 0,0.6 2.8,0.6 ; 9.8,-2.7 9.8,2.7 ; 11.2,-2.7 11.2,2.7 ; 12.4,-0.6 15.2,-0.6 15.2,0.6 12.4,0.6 ; 2.8,-2.7 2.8,2.7 12.4,2.7 12.4,-2.7 2.8,-2.7
4-TopCourty:
  circle w0.1: c0,0 r0.35
  lines w0.05: -1.525,-2.975 -1.525,2.9 16.775,2.9 16.775,-2.975 -1.525,-2.975
  lines w0.1: -0.525,0 0.525,0 ; 0,-0.525 0,0.525
7-TopAssy:
  rectangle: 10.4,-2.7 11.8,2.7
  lines w0.1: 2.8,-0.6 2.8,-2.7 12.4,-2.7 12.4,-0.6 ; 2.8,-0.6 0,-0.6 0,0 0,0.6 2.8,0.6 ; 2.8,-0.6 2.8,0.6 ; 2.8,0.6 2.8,2.7 12.4,2.7 12.4,0.6 ; 12.4,-0.6 15.2,-0.6 15.2,0 15.2,0.6 12.4,0.6 ; 12.4,-0.6 12.4,0.6
  text ".Designator" at 4.525,-0.525 h2.2
3D body "D267-03_H.STEP": height 5.46, standoff -2.54, extent -0.525,-2.675 15.78,2.659

## D267-03_V [mm]
pads (2):
  oval 2.5x3 hole 1.6: 1(0,0) 2(5.5,0)
TopOverlay:
  lines w0.2: 1.7,0 3.8,0
  lines w0.3: 3.3,-0.7 3.3,0 3.3,0.675
2-TopCompOutl:
  lines w0.1: 2.631,-0.607 cw(c0,0) 2.631,0.607 ; 0,-0.6 cw(c0,0) 0,0.6 5.1,0.6 cw(c5.1,0) 5.1,-0.6 0,-0.6
4-TopCourty:
  circle w0.1: c0,0 r0.35
  lines w0.05: -3.025,-2.975 7.05,-2.975 7.05,2.9 -3.025,2.9 -3.025,-2.975
  lines w0.1: -0.525,0 0.525,0 ; 0,-0.525 0,0.525
7-TopAssy:
  region: 3.575,0.45 4.35,0 3.575,-0.45
  lines w0.1: 2.631,-0.607 cw(c0,0) 2.631,0.607 ; 2.75,0 4.825,0 ; 4.375,-0.475 4.375,0.475 ; 0,-0.6 cw(c0,0) 0,0.6 5.1,0.6 cw(c5.1,0) 5.1,-0.6 0,-0.6 ; 3.575,-0.45 4.375,0 3.575,0.45 3.575,-0.45
  text ".Designator" at 2.375,1.75 h2.2

## D267-03_VM [mm]
pads (2):
  oval 2.5x3 hole 1.6: 1(5.5,0) 2(0,0)
TopOverlay:
  lines w0.2: 1.6,0 4,0 ; 2,-0.8 2,0.8
2-TopCompOutl:
  lines w0.1: 2.631,-0.607 cw(c0,0) 2.631,0.607 ; 0,-0.6 cw(c0,0) 0,0.6 5.1,0.6 5.1,-0.6 0,-0.6
4-TopCourty:
  circle w0.1: c0,0 r0.35
  lines w0.05: -3.025,-2.975 -3.025,2.9 7.05,2.9 7.05,-2.975 -3.025,-2.975
  lines w0.1: -0.525,0 0.525,0 ; 0,-0.525 0,0.525
7-TopAssy:
  region: 2.7,-0.45 1.925,0 2.7,0.45
  lines w0.1: 1.45,0 3.525,0 ; 1.9,-0.475 1.9,0.475 ; 2.631,-0.607 cw(c0,0) 2.631,0.607 ; 0,-0.6 cw(c0,0) 0,0.6 5.1,0.6 cw(c5.1,0) 5.1,-0.6 0,-0.6 ; 1.9,0 2.7,0.45 2.7,-0.45 1.9,0
  text ".Designator" at 2.2,2 h2.2

## D1608[0603] [mm]
pads (2):
  rect 0.9x0.95 smd: 1(-0.8,0) 2(0.8,0)
TopOverlay:
  lines w0.1: 1.6,-0.675 1.725,-0.675 1.725,0.675 1.6,0.675 ; -0.075,-0.675 0.1,-0.675 0.1,0.675 -0.075,0.675 -0.075,-0.675
2-TopCompOutl:
  lines w0.05: -0.3,-0.4 -0.3,0.4 ; 0.3,-0.4 0.3,0.4 ; -0.8,-0.4 -0.8,0 -0.8,0.4 0.8,0.4 0.8,-0.4 -0.8,-0.4
4-TopCourty:
  lines w0.05: -0.3,0 0.3,0 ; 0,-0.3 0,0.3 ; -1.5,-0.75 -1.5,0.75 1.5,0.75 1.5,-0.75 -1.5,-0.75
7-TopAssy:
  lines w0.1: -1.5,-0.7 1.5,-0.7 ; -1.5,0.7 1.5,0.7
  text ".Designator" at -1.65,-0.575 h1.8
13-SMDTopOverlay:
  lines w0.2: -1.5,-0.5 -1.5,-0.75 1.475,-0.75 1.475,-0.5 ; -1.5,0.5 -1.5,0.75 1.475,0.75 1.475,0.5
3D body "C1608[0603].STEP": height 0.5, standoff 0, extent -0.8,-0.4 0.8,0.4

## DIODE0.2 [mm]
pads (2):
  round 1.7 hole 0.9: 1(0,0) 2(5.08,0)
TopOverlay:
  lines w0.2: 1.1,0 4,0 ; 3.3,-0.65 3.3,0.65
2-TopCompOutl:
  lines w0.1: 0,0 1.15,0 ; 3.3,-0.8 3.3,0.8 ; 3.95,0 5.08,0 ; 1.15,-0.8 3.95,-0.8 3.95,0.8 1.15,0.8 1.15,-0.8
4-TopCourty:
  circle w0.1: c0,0 r0.35
  lines w0.05: -0.975,-0.95 -0.975,0.95 6.1,0.95 6.1,-0.95 -0.975,-0.95
  lines w0.1: -0.525,0 0.525,0 ; 0,-0.525 0,0.525
7-TopAssy:
  rectangle: 3.1,-0.8 3.675,0.8
  lines w0.1: 1.15,-0.175 0,-0.175 0,0.175 1.15,0.175 ; 3.95,-0.175 5.075,-0.175 5.075,0.175 3.95,0.175 ; 1.15,-0.8 3.95,-0.8 3.95,0.8 1.15,0.8 1.15,-0.8
  text ".Designator" at 0.525,1 h2.2

## DIODE0.3 [mm]
pads (2):
  round 1.6 hole 0.9: 1(0,0) 2(7.62,0)
TopOverlay:
  lines w0.2: 1.3,0 5.65,0 6.3,0 ; 5.05,-0.7 5.05,0.7
2-TopCompOutl:
  lines w0.1: 0,0 2.3,0 ; 5.05,-0.9 5.05,0.9 ; 5.8,0 7.62,0 ; 2.3,-0.9 5.8,-0.9 5.8,0.9 2.3,0.9 2.3,-0.9
4-TopCourty:
  circle w0.1: c0,0 r0.35
  lines w0.05: 8.625,-1.025 -1.025,-1.025 -1.025,1.025 8.625,1.025 8.625,-1
  lines w0.1: -0.525,0 0.525,0 ; 0,-0.525 0,0.525
5-MCadOutl:
  lines w0.1: -0.8,0 0.8,0 ; 0,-0.775 0,0.775
7-TopAssy:
  rectangle: 4.8,-0.9 5.4,0.9
  lines w0.1: 2.1,-0.2 2.1,-0.9 4,-0.9 5.6,-0.9 5.6,-0.2 ; 2.1,-0.2 0,-0.2 0,0 0,0.2 2.1,0.2 ; 2.1,-0.2 2.1,0.2 ; 2.1,0.2 2.1,0.9 4,0.9 5.6,0.9 5.6,0.2 ; 5.6,-0.2 7.7,-0.2 7.7,0 7.7,0.2 5.6,0.2 ; 5.6,-0.2 5.6,0.2
  text ".Designator" at 2.55,-0.725 h2.2
3D body "Diode0.3.STEP": height 2.07, standoff -2.54, extent -0.3,-0.85 7.919,0.867

## DIODE0.3_V [mm]
height 8
pads (2):
  round 1.5 hole 0.8: 1(0,0) 2(2.22,0)
TopOverlay:
  lines w0.2: 0.9,0 1.35,0 ; 1.2,-0.4 1.2,0.4
2-TopCompOutl:
  circle w0.1: c0,0 r1.2
  lines w0.1: 0,-0.2 2.2,-0.2 2.2,0.2 0,0.2 0,-0.2
4-TopCourty:
  circle w0.1: c0,0 r0.35
  lines w0.05: -1.375,-1.425 3.125,-1.425 3.125,1.4 -1.375,1.4 -1.375,-1.425
  lines w0.1: -0.525,0 0.525,0 ; 0,-0.525 0,0.525
7-TopAssy:
  rectangle: 1.8,-0.6 2,0.6
  region: 1.3,-0.5 1.3,0 1.95,0
  region: 1.3,0.5 1.9,0 1.3,0
  lines w0.1: 1.158,-0.316 cw(c0,0) 1.158,0.316 ; 1.3,-0.3 0,-0.3 cw(c0,0) 0,0.3 1.4,0.3 ; 2,-0.3 2.2,-0.3 ccw(c2.2,0) 2.2,0.3 2,0.3
  text ".Designator" at 0.575,0.925 h2.2

## DIODE0.4 [mm]
pads (2):
  round 2 hole 1.1: 1(0,0) 2(10.16,0)
TopOverlay:
  lines w0.2: 1.5,0 4,0 8.7,0 ; 7.35,-0.975 7.35,1.025
2-TopCompOutl:
  lines w0.1: 0,0 2.5,0 ; 6.5,-1.4 6.5,1.4 6.6,1.4 6.55,1.4 ; 7.5,0 10.16,0 ; 2.5,-1.4 7.5,-1.4 7.5,1.4 2.5,1.4 2.5,-1.4
4-TopCourty:
  circle w0.1: c0,0 r0.35
  lines w0.05: -1.175,-1.5 -1.175,1.5 11.35,1.5 11.35,-1.5 -1.175,-1.5
  lines w0.1: -0.525,0 0.525,0 ; 0,-0.525 0,0.525
5-MCadOutl:
  lines w0.1: -0.5,0 0.5,0 ; 0,-0.5 0,0.5
7-TopAssy:
  rectangle: 6.725,-1.4 7.7,1.4
  lines w0.1: 2.2,-0.3 2.2,0.3 ; 2.2,-0.3 0,-0.3 0,0 0,0.3 2.2,0.3 ; 2.2,-0.3 2.2,-1.4 5,-1.4 8,-1.4 8,-0.3 ; 2.2,0.3 2.2,1.4 5,1.4 8,1.4 8,0.3 ; 8,-0.3 8,0.3 ; 8,-0.3 10.2,-0.3 10.2,0 10.2,0.3 8,0.3
  text ".Designator" at 2.55,-0.6 h2.2
3D body "Diode0.4.STEP": height 2.54, standoff -2.54, extent -0.375,-1.275 10.545,1.285